# Altium footprint library Lib_001.PcbLib: 429 footprints (part 4 of 28)
Each footprint in its own frame and in the unit in brackets; x right, y up, seen from the top. Pads: shape width x height; smd on the part's side, far side on the other; paste and mask are expansions set on the pad; w line width, h text height; cw(c..) or ccw(c..) is an arc to the next point about the centre after c.
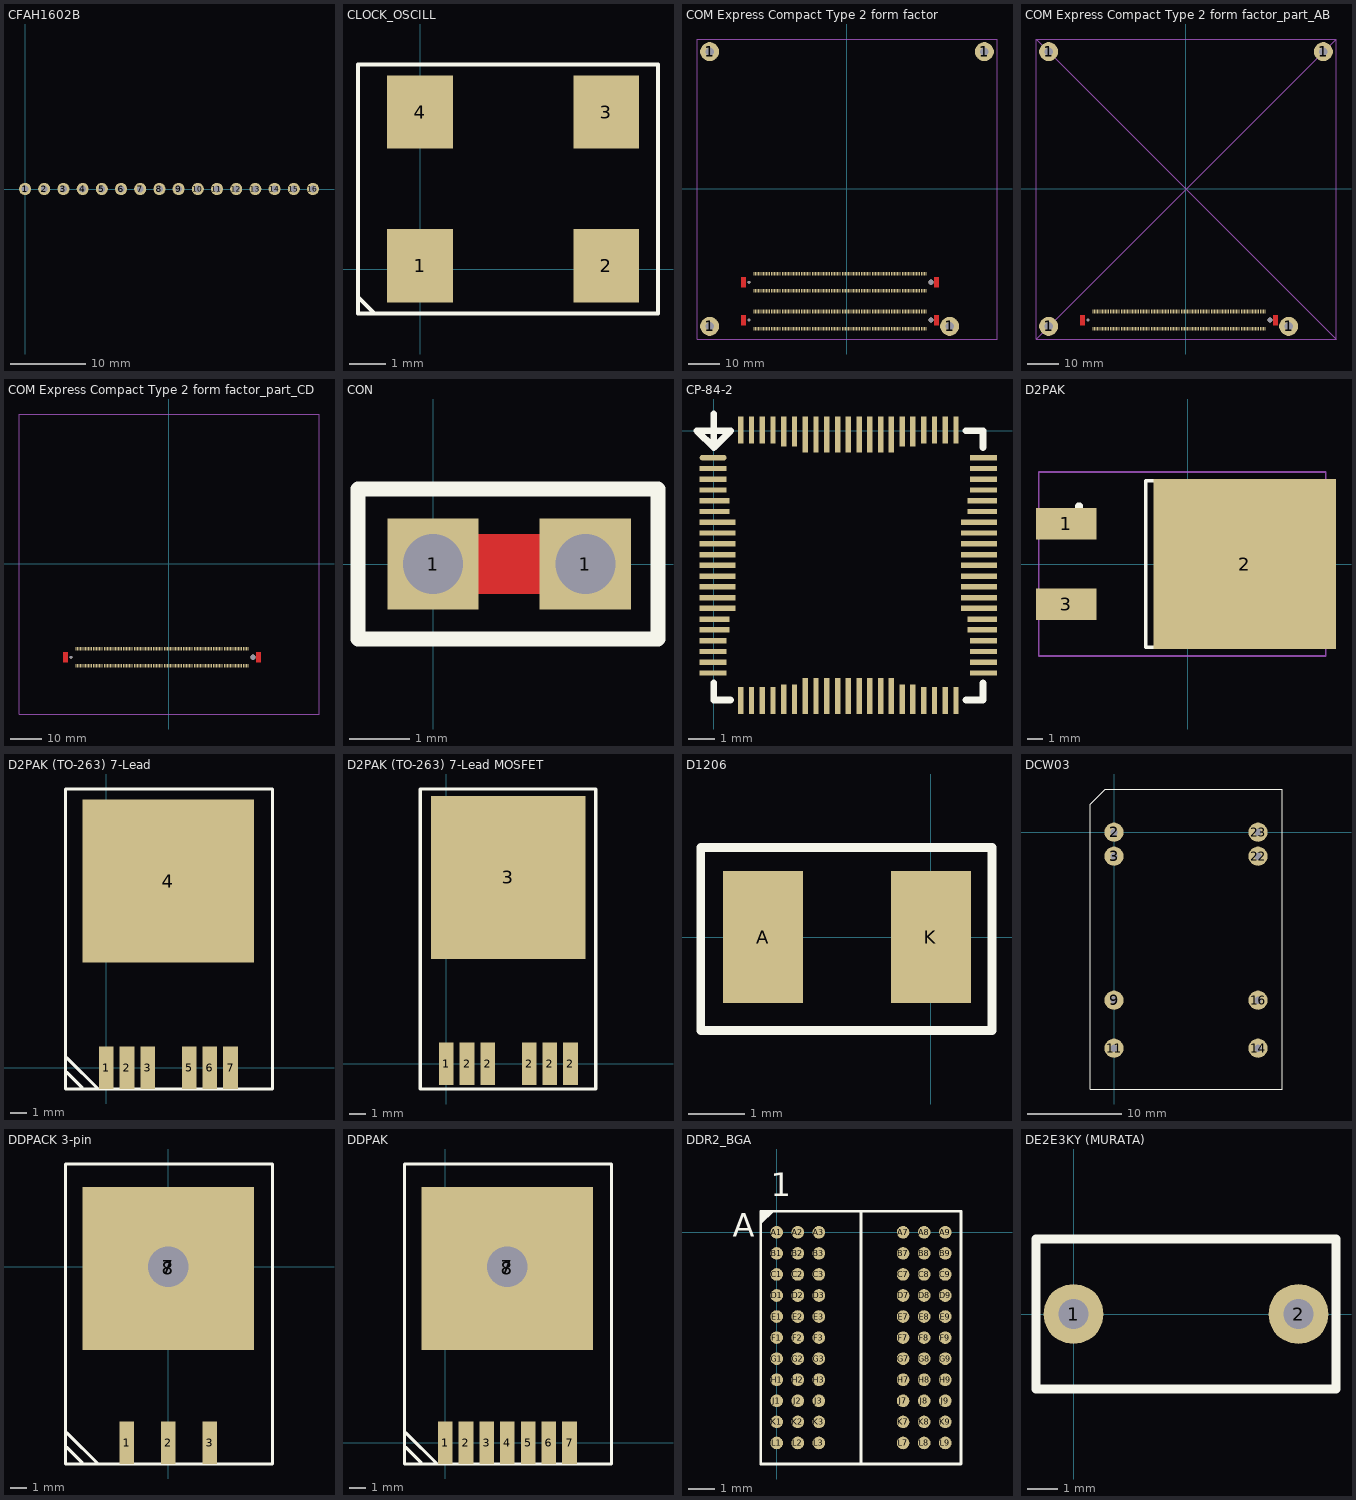
[diagram p3: the footprints below, top view; thin cyan lines are the x and y axes]

## CFAH1602B [mm]
height 6
pads (16):
  round 1.6 hole 0.9: 1(0,0) 2(2.54,0) 3(5.08,0) 4(7.62,0) 5(10.16,0) 6(12.7,0) 7(15.24,0) 8(17.78,0) 9(20.32,0) 10(22.86,0) 11(25.4,0) 12(27.94,0) 13(30.48,0) 14(33.02,0) 15(35.56,0) 16(38.1,0)
3D body "User Library-LCD module 16 X 2 backlight.step": height 18.02, standoff 4.81, extent -8.05,-34.5 72.45,2

## CLOCK_OSCILL [mm]
pads (4):
  rect 1.8x2 smd: 1(0,0.1) 2(5.08,0.1) 3(5.08,4.3) 4(0,4.3)
Top Overlay:
  lines w0.102: -1.698,-0.75 -1.25,-1.199 ; -1.698,-1.199 -1.698,5.595 -1.299,5.595 6.494,5.595 6.494,-1.199 -1.698,-1.199
3D body "User Library-KXO-97V.step": height 1.3, standoff 0, extent -0.98,-0.262 6.02,4.818

## COM Express Compact Type 2 form factor [mm]
pads (444):
  round 6 hole 2.7: 1(-43.5,-43.5) 1(-43.5,43.5) 1(32.5,-43.5) 1(43.5,43.5)
  rect 0.3x1.2 smd: A1(-29.475,-44.225) A2(-28.975,-44.225) A3(-28.475,-44.225) A4(-27.975,-44.225) A5(-27.475,-44.225) A6(-26.975,-44.225) A7(-26.475,-44.225) A8(-25.975,-44.225) A9(-25.475,-44.225) A10(-24.975,-44.225) A11(-24.475,-44.225) A12(-23.975,-44.225) A13(-23.475,-44.225) A14(-22.975,-44.225) A15(-22.475,-44.225) A16(-21.975,-44.225) A17(-21.475,-44.225) A18(-20.975,-44.225) A19(-20.475,-44.225) A20(-19.975,-44.225) A21(-19.475,-44.225) A22(-18.975,-44.225) A23(-18.475,-44.225) A24(-17.975,-44.225) A25(-17.475,-44.225) A26(-16.975,-44.225) A27(-16.475,-44.225) A28(-15.975,-44.225) A29(-15.475,-44.225) A30(-14.975,-44.225) A31(-14.475,-44.225) A32(-13.975,-44.225) A33(-13.475,-44.225) A34(-12.975,-44.225) A35(-12.475,-44.225) A36(-11.975,-44.225) A37(-11.475,-44.225) A38(-10.975,-44.225) A39(-10.475,-44.225) A40(-9.975,-44.225) A41(-9.475,-44.225) A42(-8.975,-44.225) A43(-8.475,-44.225) A44(-7.975,-44.225) A45(-7.475,-44.225) A46(-6.975,-44.225) A47(-6.475,-44.225) A48(-5.975,-44.225) A49(-5.475,-44.225) A50(-4.975,-44.225) A51(-4.475,-44.225) A52(-3.975,-44.225) A53(-3.475,-44.225) A54(-2.975,-44.225) A55(-2.475,-44.225) A56(-1.975,-44.225) A57(-1.475,-44.225) A58(-0.975,-44.225) A59(-0.475,-44.225) A60(0.025,-44.225) A61(0.525,-44.225) A62(1.025,-44.225) A63(1.525,-44.225) A64(2.025,-44.225) A65(2.525,-44.225) A66(3.025,-44.225) A67(3.525,-44.225) A68(4.025,-44.225) A69(4.525,-44.225) A70(5.025,-44.225) A71(5.525,-44.225) A72(6.025,-44.225) A73(6.525,-44.225) A74(7.025,-44.225) A75(7.525,-44.225) A76(8.025,-44.225) A77(8.525,-44.225) A78(9.025,-44.225) A79(9.525,-44.225) A80(10.025,-44.225) A81(10.525,-44.225) A82(11.025,-44.225) A83(11.525,-44.225) A84(12.025,-44.225) A85(12.525,-44.225) A86(13.025,-44.225) A87(13.525,-44.225) A88(14.025,-44.225) A89(14.525,-44.225) A90(15.025,-44.225) A91(15.525,-44.225) A92(16.025,-44.225) A93(16.525,-44.225) A94(17.025,-44.225) A95(17.525,-44.225) A96(18.025,-44.225) A97(18.525,-44.225) A98(19.025,-44.225) A99(19.525,-44.225) A100(20.025,-44.225) A101(20.525,-44.225) A102(21.025,-44.225) A103(21.525,-44.225) A104(22.025,-44.225) A105(22.525,-44.225) A106(23.025,-44.225) A107(23.525,-44.225) A108(24.025,-44.225) A109(24.525,-44.225) A110(25.025,-44.225) B1(-29.475,-38.825) B2(-28.975,-38.825) B3(-28.475,-38.825) B4(-27.975,-38.825) B5(-27.475,-38.825) B6(-26.975,-38.825) B7(-26.475,-38.825) B8(-25.975,-38.825) B9(-25.475,-38.825) B10(-24.975,-38.825) B11(-24.475,-38.825) B12(-23.975,-38.825) B13(-23.475,-38.825) B14(-22.975,-38.825) B15(-22.475,-38.825) B16(-21.975,-38.825) B17(-21.475,-38.825) B18(-20.975,-38.825) B19(-20.475,-38.825) B20(-19.975,-38.825) B21(-19.475,-38.825) B22(-18.975,-38.825) B23(-18.475,-38.825) B24(-17.975,-38.825) B25(-17.475,-38.825) B26(-16.975,-38.825) B27(-16.475,-38.825) B28(-15.975,-38.825) B29(-15.475,-38.825) B30(-14.975,-38.825) B31(-14.475,-38.825) B32(-13.975,-38.825) B33(-13.475,-38.825) B34(-12.975,-38.825) B35(-12.475,-38.825) B36(-11.975,-38.825) B37(-11.475,-38.825) B38(-10.975,-38.825) B39(-10.475,-38.825) B40(-9.975,-38.825) B41(-9.475,-38.825) B42(-8.975,-38.825) B43(-8.475,-38.825) B44(-7.975,-38.825) B45(-7.475,-38.825) B46(-6.975,-38.825) B47(-6.475,-38.825) B48(-5.975,-38.825) B49(-5.475,-38.825) B50(-4.975,-38.825) B51(-4.475,-38.825) B52(-3.975,-38.825) B53(-3.475,-38.825) B54(-2.975,-38.825) B55(-2.475,-38.825) B56(-1.975,-38.825) B57(-1.475,-38.825) B58(-0.975,-38.825) B59(-0.475,-38.825) B60(0.025,-38.825) B61(0.525,-38.825) B62(1.025,-38.825) B63(1.525,-38.825) B64(2.025,-38.825) B65(2.525,-38.825) B66(3.025,-38.825) B67(3.525,-38.825) B68(4.025,-38.825) B69(4.525,-38.825) B70(5.025,-38.825) B71(5.525,-38.825) B72(6.025,-38.825) B73(6.525,-38.825) B74(7.025,-38.825) B75(7.525,-38.825) B76(8.025,-38.825) B77(8.525,-38.825) B78(9.025,-38.825) B79(9.525,-38.825) B80(10.025,-38.825) B81(10.525,-38.825) B82(11.025,-38.825) B83(11.525,-38.825) B84(12.025,-38.825) B85(12.525,-38.825) B86(13.025,-38.825) B87(13.525,-38.825) B88(14.025,-38.825) B89(14.525,-38.825) B90(15.025,-38.825) B91(15.525,-38.825) B92(16.025,-38.825) B93(16.525,-38.825) B94(17.025,-38.825) B95(17.525,-38.825) B96(18.025,-38.825) B97(18.525,-38.825) B98(19.025,-38.825) B99(19.525,-38.825) B100(20.025,-38.825) B101(20.525,-38.825) B102(21.025,-38.825) B103(21.525,-38.825) B104(22.025,-38.825) B105(22.525,-38.825) B106(23.025,-38.825) B107(23.525,-38.825) B108(24.025,-38.825) B109(24.525,-38.825) B110(25.025,-38.825) C1(-29.475,-32.225) C2(-28.975,-32.225) C3(-28.475,-32.225) C4(-27.975,-32.225) C5(-27.475,-32.225) C6(-26.975,-32.225) C7(-26.475,-32.225) C8(-25.975,-32.225) C9(-25.475,-32.225) C10(-24.975,-32.225) C11(-24.475,-32.225) C12(-23.975,-32.225) C13(-23.475,-32.225) C14(-22.975,-32.225) C15(-22.475,-32.225) C16(-21.975,-32.225) C17(-21.475,-32.225) C18(-20.975,-32.225) C19(-20.475,-32.225) C20(-19.975,-32.225) C21(-19.475,-32.225) C22(-18.975,-32.225) C23(-18.475,-32.225) C24(-17.975,-32.225) C25(-17.475,-32.225) C26(-16.975,-32.225) C27(-16.475,-32.225) C28(-15.975,-32.225) C29(-15.475,-32.225) C30(-14.975,-32.225) C31(-14.475,-32.225) C32(-13.975,-32.225) C33(-13.475,-32.225) C34(-12.975,-32.225) C35(-12.475,-32.225) C36(-11.975,-32.225) C37(-11.475,-32.225) C38(-10.975,-32.225) C39(-10.475,-32.225) C40(-9.975,-32.225) C41(-9.475,-32.225) C42(-8.975,-32.225) C43(-8.475,-32.225) C44(-7.975,-32.225) C45(-7.475,-32.225) C46(-6.975,-32.225) C47(-6.475,-32.225) C48(-5.975,-32.225) C49(-5.475,-32.225) C50(-4.975,-32.225) C51(-4.475,-32.225) C52(-3.975,-32.225) C53(-3.475,-32.225) C54(-2.975,-32.225) C55(-2.475,-32.225) C56(-1.975,-32.225) C57(-1.475,-32.225) C58(-0.975,-32.225) C59(-0.475,-32.225) C60(0.025,-32.225) C61(0.525,-32.225) C62(1.025,-32.225) C63(1.525,-32.225) C64(2.025,-32.225) C65(2.525,-32.225) C66(3.025,-32.225) C67(3.525,-32.225) C68(4.025,-32.225) C69(4.525,-32.225) C70(5.025,-32.225) C71(5.525,-32.225) C72(6.025,-32.225) C73(6.525,-32.225) C74(7.025,-32.225) C75(7.525,-32.225) C76(8.025,-32.225) C77(8.525,-32.225) C78(9.025,-32.225) C79(9.525,-32.225) C80(10.025,-32.225) C81(10.525,-32.225) C82(11.025,-32.225) C83(11.525,-32.225) C84(12.025,-32.225) C85(12.525,-32.225) C86(13.025,-32.225) C87(13.525,-32.225) C88(14.025,-32.225) C89(14.525,-32.225) C90(15.025,-32.225) C91(15.525,-32.225) C92(16.025,-32.225) C93(16.525,-32.225) C94(17.025,-32.225) C95(17.525,-32.225) C96(18.025,-32.225) C97(18.525,-32.225) C98(19.025,-32.225) C99(19.525,-32.225) C100(20.025,-32.225) C101(20.525,-32.225) C102(21.025,-32.225) C103(21.525,-32.225) C104(22.025,-32.225) C105(22.525,-32.225) C106(23.025,-32.225) C107(23.525,-32.225) C108(24.025,-32.225) C109(24.525,-32.225) C110(25.025,-32.225) D1(-29.475,-26.825) D2(-28.975,-26.825) D3(-28.475,-26.825) D4(-27.975,-26.825) D5(-27.475,-26.825) D6(-26.975,-26.825) D7(-26.475,-26.825) D8(-25.975,-26.825) D9(-25.475,-26.825) D10(-24.975,-26.825) D11(-24.475,-26.825) D12(-23.975,-26.825) D13(-23.475,-26.825) D14(-22.975,-26.825) D15(-22.475,-26.825) D16(-21.975,-26.825) D17(-21.475,-26.825) D18(-20.975,-26.825) D19(-20.475,-26.825) D20(-19.975,-26.825) D21(-19.475,-26.825) D22(-18.975,-26.825) D23(-18.475,-26.825) D24(-17.975,-26.825) D25(-17.475,-26.825) D26(-16.975,-26.825) D27(-16.475,-26.825) D28(-15.975,-26.825) D29(-15.475,-26.825) D30(-14.975,-26.825) D31(-14.475,-26.825) D32(-13.975,-26.825) D33(-13.475,-26.825) D34(-12.975,-26.825) D35(-12.475,-26.825) D36(-11.975,-26.825) D37(-11.475,-26.825) D38(-10.975,-26.825) D39(-10.475,-26.825) D40(-9.975,-26.825) D41(-9.475,-26.825) D42(-8.975,-26.825) D43(-8.475,-26.825) D44(-7.975,-26.825) D45(-7.475,-26.825) D46(-6.975,-26.825) D47(-6.475,-26.825) D48(-5.975,-26.825) D49(-5.475,-26.825) D50(-4.975,-26.825) D51(-4.475,-26.825) D52(-3.975,-26.825) D53(-3.475,-26.825) D54(-2.975,-26.825) D55(-2.475,-26.825) D56(-1.975,-26.825) D57(-1.475,-26.825) D58(-0.975,-26.825) D59(-0.475,-26.825) D60(0.025,-26.825) D61(0.525,-26.825) D62(1.025,-26.825) D63(1.525,-26.825) D64(2.025,-26.825) D65(2.525,-26.825) D66(3.025,-26.825) D67(3.525,-26.825) D68(4.025,-26.825) D69(4.525,-26.825) D70(5.025,-26.825) D71(5.525,-26.825) D72(6.025,-26.825) D73(6.525,-26.825) D74(7.025,-26.825) D75(7.525,-26.825) D76(8.025,-26.825) D77(8.525,-26.825) D78(9.025,-26.825) D79(9.525,-26.825) D80(10.025,-26.825) D81(10.525,-26.825) D82(11.025,-26.825) D83(11.525,-26.825) D84(12.025,-26.825) D85(12.525,-26.825) D86(13.025,-26.825) D87(13.525,-26.825) D88(14.025,-26.825) D89(14.525,-26.825) D90(15.025,-26.825) D91(15.525,-26.825) D92(16.025,-26.825) D93(16.525,-26.825) D94(17.025,-26.825) D95(17.525,-26.825) D96(18.025,-26.825) D97(18.525,-26.825) D98(19.025,-26.825) D99(19.525,-26.825) D100(20.025,-26.825) D101(20.525,-26.825) D102(21.025,-26.825) D103(21.525,-26.825) D104(22.025,-26.825) D105(22.525,-26.825) D106(23.025,-26.825) D107(23.525,-26.825) D108(24.025,-26.825) D109(24.525,-26.825) D110(25.025,-26.825)
via -31.075,-41.525 diameter 0.9 hole 0.9
via 26.625,-41.525 diameter 1.6 hole 1.6
via -31.075,-29.525 diameter 0.9 hole 0.9
via 26.625,-29.525 diameter 1.6 hole 1.6
Top Layer:
  region: -31.975,-39.875 -33.625,-39.875 -33.625,-43.175 -31.975,-43.175
  region: 29.175,-39.875 27.525,-39.875 27.525,-43.175 29.175,-43.175
  region: -31.975,-27.875 -33.625,-27.875 -33.625,-31.175 -31.975,-31.175
  region: 29.175,-27.875 27.525,-27.875 27.525,-31.175 29.175,-31.175
Mechanical 1:
  lines w0.2: -47.5,-47.5 47.5,-47.5 47.5,47.5 -47.5,47.5 -47.5,-47.5
Mechanical 7:
  lines w0.2: -47.5,-47.5 -47.5,47.5 47.5,47.5 47.5,-47.5 -47.5,-47.5
Multi-Layer:
  lines w0.15: -47.5,-47.5 47.5,47.5 ; -47.5,47.5 47.5,-47.5
3D body "ept_401-55101-5x_3D.STEP": height 7.45, standoff -0.6, extent -33.125,-44.625 28.675,-38.425
3D body "ept_401-55101-5x_3D.STEP": height 7.45, standoff -0.6, extent -33.125,-32.625 28.675,-26.425

## COM Express Compact Type 2 form factor_part_AB [mm]
pads (224):
  round 6 hole 2.7: 1(-43.5,-43.5) 1(-43.5,43.5) 1(32.5,-43.5) 1(43.5,43.5)
  rect 0.3x1.2 smd: A1(-29.475,-44.225) A2(-28.975,-44.225) A3(-28.475,-44.225) A4(-27.975,-44.225) A5(-27.475,-44.225) A6(-26.975,-44.225) A7(-26.475,-44.225) A8(-25.975,-44.225) A9(-25.475,-44.225) A10(-24.975,-44.225) A11(-24.475,-44.225) A12(-23.975,-44.225) A13(-23.475,-44.225) A14(-22.975,-44.225) A15(-22.475,-44.225) A16(-21.975,-44.225) A17(-21.475,-44.225) A18(-20.975,-44.225) A19(-20.475,-44.225) A20(-19.975,-44.225) A21(-19.475,-44.225) A22(-18.975,-44.225) A23(-18.475,-44.225) A24(-17.975,-44.225) A25(-17.475,-44.225) A26(-16.975,-44.225) A27(-16.475,-44.225) A28(-15.975,-44.225) A29(-15.475,-44.225) A30(-14.975,-44.225) A31(-14.475,-44.225) A32(-13.975,-44.225) A33(-13.475,-44.225) A34(-12.975,-44.225) A35(-12.475,-44.225) A36(-11.975,-44.225) A37(-11.475,-44.225) A38(-10.975,-44.225) A39(-10.475,-44.225) A40(-9.975,-44.225) A41(-9.475,-44.225) A42(-8.975,-44.225) A43(-8.475,-44.225) A44(-7.975,-44.225) A45(-7.475,-44.225) A46(-6.975,-44.225) A47(-6.475,-44.225) A48(-5.975,-44.225) A49(-5.475,-44.225) A50(-4.975,-44.225) A51(-4.475,-44.225) A52(-3.975,-44.225) A53(-3.475,-44.225) A54(-2.975,-44.225) A55(-2.475,-44.225) A56(-1.975,-44.225) A57(-1.475,-44.225) A58(-0.975,-44.225) A59(-0.475,-44.225) A60(0.025,-44.225) A61(0.525,-44.225) A62(1.025,-44.225) A63(1.525,-44.225) A64(2.025,-44.225) A65(2.525,-44.225) A66(3.025,-44.225) A67(3.525,-44.225) A68(4.025,-44.225) A69(4.525,-44.225) A70(5.025,-44.225) A71(5.525,-44.225) A72(6.025,-44.225) A73(6.525,-44.225) A74(7.025,-44.225) A75(7.525,-44.225) A76(8.025,-44.225) A77(8.525,-44.225) A78(9.025,-44.225) A79(9.525,-44.225) A80(10.025,-44.225) A81(10.525,-44.225) A82(11.025,-44.225) A83(11.525,-44.225) A84(12.025,-44.225) A85(12.525,-44.225) A86(13.025,-44.225) A87(13.525,-44.225) A88(14.025,-44.225) A89(14.525,-44.225) A90(15.025,-44.225) A91(15.525,-44.225) A92(16.025,-44.225) A93(16.525,-44.225) A94(17.025,-44.225) A95(17.525,-44.225) A96(18.025,-44.225) A97(18.525,-44.225) A98(19.025,-44.225) A99(19.525,-44.225) A100(20.025,-44.225) A101(20.525,-44.225) A102(21.025,-44.225) A103(21.525,-44.225) A104(22.025,-44.225) A105(22.525,-44.225) A106(23.025,-44.225) A107(23.525,-44.225) A108(24.025,-44.225) A109(24.525,-44.225) A110(25.025,-44.225) B1(-29.475,-38.825) B2(-28.975,-38.825) B3(-28.475,-38.825) B4(-27.975,-38.825) B5(-27.475,-38.825) B6(-26.975,-38.825) B7(-26.475,-38.825) B8(-25.975,-38.825) B9(-25.475,-38.825) B10(-24.975,-38.825) B11(-24.475,-38.825) B12(-23.975,-38.825) B13(-23.475,-38.825) B14(-22.975,-38.825) B15(-22.475,-38.825) B16(-21.975,-38.825) B17(-21.475,-38.825) B18(-20.975,-38.825) B19(-20.475,-38.825) B20(-19.975,-38.825) B21(-19.475,-38.825) B22(-18.975,-38.825) B23(-18.475,-38.825) B24(-17.975,-38.825) B25(-17.475,-38.825) B26(-16.975,-38.825) B27(-16.475,-38.825) B28(-15.975,-38.825) B29(-15.475,-38.825) B30(-14.975,-38.825) B31(-14.475,-38.825) B32(-13.975,-38.825) B33(-13.475,-38.825) B34(-12.975,-38.825) B35(-12.475,-38.825) B36(-11.975,-38.825) B37(-11.475,-38.825) B38(-10.975,-38.825) B39(-10.475,-38.825) B40(-9.975,-38.825) B41(-9.475,-38.825) B42(-8.975,-38.825) B43(-8.475,-38.825) B44(-7.975,-38.825) B45(-7.475,-38.825) B46(-6.975,-38.825) B47(-6.475,-38.825) B48(-5.975,-38.825) B49(-5.475,-38.825) B50(-4.975,-38.825) B51(-4.475,-38.825) B52(-3.975,-38.825) B53(-3.475,-38.825) B54(-2.975,-38.825) B55(-2.475,-38.825) B56(-1.975,-38.825) B57(-1.475,-38.825) B58(-0.975,-38.825) B59(-0.475,-38.825) B60(0.025,-38.825) B61(0.525,-38.825) B62(1.025,-38.825) B63(1.525,-38.825) B64(2.025,-38.825) B65(2.525,-38.825) B66(3.025,-38.825) B67(3.525,-38.825) B68(4.025,-38.825) B69(4.525,-38.825) B70(5.025,-38.825) B71(5.525,-38.825) B72(6.025,-38.825) B73(6.525,-38.825) B74(7.025,-38.825) B75(7.525,-38.825) B76(8.025,-38.825) B77(8.525,-38.825) B78(9.025,-38.825) B79(9.525,-38.825) B80(10.025,-38.825) B81(10.525,-38.825) B82(11.025,-38.825) B83(11.525,-38.825) B84(12.025,-38.825) B85(12.525,-38.825) B86(13.025,-38.825) B87(13.525,-38.825) B88(14.025,-38.825) B89(14.525,-38.825) B90(15.025,-38.825) B91(15.525,-38.825) B92(16.025,-38.825) B93(16.525,-38.825) B94(17.025,-38.825) B95(17.525,-38.825) B96(18.025,-38.825) B97(18.525,-38.825) B98(19.025,-38.825) B99(19.525,-38.825) B100(20.025,-38.825) B101(20.525,-38.825) B102(21.025,-38.825) B103(21.525,-38.825) B104(22.025,-38.825) B105(22.525,-38.825) B106(23.025,-38.825) B107(23.525,-38.825) B108(24.025,-38.825) B109(24.525,-38.825) B110(25.025,-38.825)
via -31.075,-41.525 diameter 0.9 hole 0.9
via 26.625,-41.525 diameter 1.6 hole 1.6
Top Layer:
  region: -31.975,-39.875 -33.625,-39.875 -33.625,-43.175 -31.975,-43.175
  region: 29.175,-39.875 27.525,-39.875 27.525,-43.175 29.175,-43.175
Mechanical 1:
  lines w0.15: -47.5,-47.5 47.5,47.5 ; -47.5,47.5 47.5,-47.5
  lines w0.2: -47.5,-47.5 47.5,-47.5 47.5,47.5 -47.5,47.5 -47.5,-47.5
Mechanical 7:
  lines w0.2: -47.5,-47.5 -47.5,47.5 47.5,47.5 47.5,-47.5 -47.5,-47.5
3D body "ept_401-55101-5x_3D.STEP": height 7.45, standoff -0.6, extent -33.125,-44.625 28.675,-38.425

## COM Express Compact Type 2 form factor_part_CD [mm]
pads (220):
  rect 0.3x1.2 smd: C1(-29.475,-32.225) C2(-28.975,-32.225) C3(-28.475,-32.225) C4(-27.975,-32.225) C5(-27.475,-32.225) C6(-26.975,-32.225) C7(-26.475,-32.225) C8(-25.975,-32.225) C9(-25.475,-32.225) C10(-24.975,-32.225) C11(-24.475,-32.225) C12(-23.975,-32.225) C13(-23.475,-32.225) C14(-22.975,-32.225) C15(-22.475,-32.225) C16(-21.975,-32.225) C17(-21.475,-32.225) C18(-20.975,-32.225) C19(-20.475,-32.225) C20(-19.975,-32.225) C21(-19.475,-32.225) C22(-18.975,-32.225) C23(-18.475,-32.225) C24(-17.975,-32.225) C25(-17.475,-32.225) C26(-16.975,-32.225) C27(-16.475,-32.225) C28(-15.975,-32.225) C29(-15.475,-32.225) C30(-14.975,-32.225) C31(-14.475,-32.225) C32(-13.975,-32.225) C33(-13.475,-32.225) C34(-12.975,-32.225) C35(-12.475,-32.225) C36(-11.975,-32.225) C37(-11.475,-32.225) C38(-10.975,-32.225) C39(-10.475,-32.225) C40(-9.975,-32.225) C41(-9.475,-32.225) C42(-8.975,-32.225) C43(-8.475,-32.225) C44(-7.975,-32.225) C45(-7.475,-32.225) C46(-6.975,-32.225) C47(-6.475,-32.225) C48(-5.975,-32.225) C49(-5.475,-32.225) C50(-4.975,-32.225) C51(-4.475,-32.225) C52(-3.975,-32.225) C53(-3.475,-32.225) C54(-2.975,-32.225) C55(-2.475,-32.225) C56(-1.975,-32.225) C57(-1.475,-32.225) C58(-0.975,-32.225) C59(-0.475,-32.225) C60(0.025,-32.225) C61(0.525,-32.225) C62(1.025,-32.225) C63(1.525,-32.225) C64(2.025,-32.225) C65(2.525,-32.225) C66(3.025,-32.225) C67(3.525,-32.225) C68(4.025,-32.225) C69(4.525,-32.225) C70(5.025,-32.225) C71(5.525,-32.225) C72(6.025,-32.225) C73(6.525,-32.225) C74(7.025,-32.225) C75(7.525,-32.225) C76(8.025,-32.225) C77(8.525,-32.225) C78(9.025,-32.225) C79(9.525,-32.225) C80(10.025,-32.225) C81(10.525,-32.225) C82(11.025,-32.225) C83(11.525,-32.225) C84(12.025,-32.225) C85(12.525,-32.225) C86(13.025,-32.225) C87(13.525,-32.225) C88(14.025,-32.225) C89(14.525,-32.225) C90(15.025,-32.225) C91(15.525,-32.225) C92(16.025,-32.225) C93(16.525,-32.225) C94(17.025,-32.225) C95(17.525,-32.225) C96(18.025,-32.225) C97(18.525,-32.225) C98(19.025,-32.225) C99(19.525,-32.225) C100(20.025,-32.225) C101(20.525,-32.225) C102(21.025,-32.225) C103(21.525,-32.225) C104(22.025,-32.225) C105(22.525,-32.225) C106(23.025,-32.225) C107(23.525,-32.225) C108(24.025,-32.225) C109(24.525,-32.225) C110(25.025,-32.225) D1(-29.475,-26.825) D2(-28.975,-26.825) D3(-28.475,-26.825) D4(-27.975,-26.825) D5(-27.475,-26.825) D6(-26.975,-26.825) D7(-26.475,-26.825) D8(-25.975,-26.825) D9(-25.475,-26.825) D10(-24.975,-26.825) D11(-24.475,-26.825) D12(-23.975,-26.825) D13(-23.475,-26.825) D14(-22.975,-26.825) D15(-22.475,-26.825) D16(-21.975,-26.825) D17(-21.475,-26.825) D18(-20.975,-26.825) D19(-20.475,-26.825) D20(-19.975,-26.825) D21(-19.475,-26.825) D22(-18.975,-26.825) D23(-18.475,-26.825) D24(-17.975,-26.825) D25(-17.475,-26.825) D26(-16.975,-26.825) D27(-16.475,-26.825) D28(-15.975,-26.825) D29(-15.475,-26.825) D30(-14.975,-26.825) D31(-14.475,-26.825) D32(-13.975,-26.825) D33(-13.475,-26.825) D34(-12.975,-26.825) D35(-12.475,-26.825) D36(-11.975,-26.825) D37(-11.475,-26.825) D38(-10.975,-26.825) D39(-10.475,-26.825) D40(-9.975,-26.825) D41(-9.475,-26.825) D42(-8.975,-26.825) D43(-8.475,-26.825) D44(-7.975,-26.825) D45(-7.475,-26.825) D46(-6.975,-26.825) D47(-6.475,-26.825) D48(-5.975,-26.825) D49(-5.475,-26.825) D50(-4.975,-26.825) D51(-4.475,-26.825) D52(-3.975,-26.825) D53(-3.475,-26.825) D54(-2.975,-26.825) D55(-2.475,-26.825) D56(-1.975,-26.825) D57(-1.475,-26.825) D58(-0.975,-26.825) D59(-0.475,-26.825) D60(0.025,-26.825) D61(0.525,-26.825) D62(1.025,-26.825) D63(1.525,-26.825) D64(2.025,-26.825) D65(2.525,-26.825) D66(3.025,-26.825) D67(3.525,-26.825) D68(4.025,-26.825) D69(4.525,-26.825) D70(5.025,-26.825) D71(5.525,-26.825) D72(6.025,-26.825) D73(6.525,-26.825) D74(7.025,-26.825) D75(7.525,-26.825) D76(8.025,-26.825) D77(8.525,-26.825) D78(9.025,-26.825) D79(9.525,-26.825) D80(10.025,-26.825) D81(10.525,-26.825) D82(11.025,-26.825) D83(11.525,-26.825) D84(12.025,-26.825) D85(12.525,-26.825) D86(13.025,-26.825) D87(13.525,-26.825) D88(14.025,-26.825) D89(14.525,-26.825) D90(15.025,-26.825) D91(15.525,-26.825) D92(16.025,-26.825) D93(16.525,-26.825) D94(17.025,-26.825) D95(17.525,-26.825) D96(18.025,-26.825) D97(18.525,-26.825) D98(19.025,-26.825) D99(19.525,-26.825) D100(20.025,-26.825) D101(20.525,-26.825) D102(21.025,-26.825) D103(21.525,-26.825) D104(22.025,-26.825) D105(22.525,-26.825) D106(23.025,-26.825) D107(23.525,-26.825) D108(24.025,-26.825) D109(24.525,-26.825) D110(25.025,-26.825)
via -31.075,-29.525 diameter 0.9 hole 0.9
via 26.625,-29.525 diameter 1.6 hole 1.6
Top Layer:
  region: -31.975,-27.875 -33.625,-27.875 -33.625,-31.175 -31.975,-31.175
  region: 29.175,-27.875 27.525,-27.875 27.525,-31.175 29.175,-31.175
Mechanical 1:
  lines w0.2: -47.5,-47.5 47.5,-47.5 47.5,47.5 -47.5,47.5 -47.5,-47.5
Mechanical 7:
  lines w0.2: -47.5,-47.5 -47.5,47.5 47.5,47.5 47.5,-47.5 -47.5,-47.5
Multi-Layer:
  lines w0.15: -47.5,-47.5 47.5,47.5 ; -47.5,47.5 47.5,-47.5
3D body "ept_401-55101-5x_3D.STEP": height 7.45, standoff -0.6, extent -33.125,-32.625 28.675,-26.425

## CON [mil]
pads (2):
  rect 60x60 hole 39.37: 1(0,0) 1(100,0)
Top Layer:
  lines w39.37: 0,0 98.43,0
Top Overlay:
  lines w10: -49.21,-49.21 -49.21,49.21 -39.37,49.21 147.64,49.21 147.64,-49.21 -49.21,-49.21

## CP-84-2 [mm]
pads (84):
  oval 1x0.2 smd: 1(-0.025,-1)
  rect 1x0.2 smd: 2(-0.025,-1.4) 3(-0.025,-1.8) 4(-0.025,-2.2) 18(-0.025,-7.8) 19(-0.025,-8.2) 20(-0.025,-8.6) 21(-0.025,-9) 43(10.025,-9) 44(10.025,-8.6) 45(10.025,-8.2) 46(10.025,-7.8) 60(10.025,-2.2) 61(10.025,-1.8) 62(10.025,-1.4) 63(10.025,-1)
  rect 1.1x0.2 smd: 5(0.025,-2.6) 6(0.025,-3) 16(0.025,-7) 17(0.025,-7.4) 47(9.975,-7.4) 48(9.975,-7) 58(9.975,-3) 59(9.975,-2.6)
  rect 1.33x0.2 smd: 7(0.14,-3.4) 8(0.14,-3.8) 9(0.14,-4.2) 10(0.14,-4.6) 11(0.14,-5) 12(0.14,-5.4) 13(0.14,-5.8) 14(0.14,-6.2) 15(0.14,-6.6) 49(9.86,-6.6) 50(9.86,-6.2) 51(9.86,-5.8) 52(9.86,-5.4) 53(9.86,-5) 54(9.86,-4.6) 55(9.86,-4.2) 56(9.86,-3.8) 57(9.86,-3.4)
  rect 0.2x1 smd: 22(1,-10.025) 23(1.4,-10.025) 24(1.8,-10.025) 25(2.2,-10.025) 39(7.8,-10.025) 40(8.2,-10.025) 41(8.6,-10.025) 42(9,-10.025) 64(9,0.025) 65(8.6,0.025) 66(8.2,0.025) 67(7.8,0.025) 81(2.2,0.025) 82(1.8,0.025) 83(1.4,0.025) 84(1,0.025)
  rect 0.2x1.1 smd: 26(2.6,-9.975) 27(3,-9.975) 37(7,-9.975) 38(7.4,-9.975) 68(7.4,-0.025) 69(7,-0.025) 79(3,-0.025) 80(2.6,-0.025)
  rect 0.2x1.33 smd: 28(3.4,-9.86) 29(3.8,-9.86) 30(4.2,-9.86) 31(4.6,-9.86) 32(5,-9.86) 33(5.4,-9.86) 34(5.8,-9.86) 35(6.2,-9.86) 36(6.6,-9.86) 70(6.6,-0.14) 71(6.2,-0.14) 72(5.8,-0.14) 73(5.4,-0.14) 74(5,-0.14) 75(4.6,-0.14) 76(4.2,-0.14) 77(3.8,-0.14) 78(3.4,-0.14)
Top Overlay:
  lines w0.254: 0,-9.375 0,-10 0.625,-10 ; 0,0.625 0,0 ; 9.375,-10 10,-10 10,-9.375 ; 9.375,0 10,0 10,-0.625 ; 0,-0.625 0,0 ; 0,-0.625 -0.625,0 0,0 ; 0,-0.625 0.625,0 0,0
3D body: height 1.5, standoff 0, extent 0,-10 10,0
3D body: height 0.8, standoff 0, extent -0.005,-1.1 0.325,-0.9
3D body: height 0.8, standoff 0, extent -0.005,-1.5 0.325,-1.3
3D body: height 0.8, standoff 0, extent -0.005,-2.3 0.325,-2.1
3D body: height 0.8, standoff 0, extent -0.005,-1.9 0.325,-1.7
3D body: height 0.8, standoff 0, extent -0.005,-3.5 0.325,-3.3
3D body: height 0.8, standoff 0, extent -0.005,-3.9 0.325,-3.7
3D body: height 0.8, standoff 0, extent -0.005,-3.1 0.325,-2.9
3D body: height 0.8, standoff 0, extent -0.005,-2.7 0.325,-2.5
3D body: height 0.8, standoff 0, extent -0.005,-5.1 0.325,-4.9
3D body: height 0.8, standoff 0, extent -0.005,-5.5 0.325,-5.3
3D body: height 0.8, standoff 0, extent -0.005,-4.7 0.325,-4.5
3D body: height 0.8, standoff 0, extent -0.005,-4.3 0.325,-4.1
3D body: height 0.8, standoff 0, extent -0.005,-6.7 0.325,-6.5
3D body: height 0.8, standoff 0, extent -0.005,-7.1 0.325,-6.9
3D body: height 0.8, standoff 0, extent -0.005,-6.3 0.325,-6.1
3D body: height 0.8, standoff 0, extent -0.005,-5.9 0.325,-5.7
3D body: height 0.8, standoff 0, extent -0.005,-8.3 0.325,-8.1
3D body: height 0.8, standoff 0, extent -0.005,-8.7 0.325,-8.5
3D body: height 0.8, standoff 0, extent -0.005,-7.9 0.325,-7.7
3D body: height 0.8, standoff 0, extent -0.005,-7.5 0.325,-7.3
3D body: height 0.8, standoff 0, extent -0.005,-9.1 0.325,-8.9
3D body: height 0.8, standoff 0, extent 8.9,-10.005 9.1,-9.675
3D body: height 0.8, standoff 0, extent 7.3,-10.005 7.5,-9.675
3D body: height 0.8, standoff 0, extent 7.7,-10.005 7.9,-9.675
3D body: height 0.8, standoff 0, extent 8.5,-10.005 8.7,-9.675
3D body: height 0.8, standoff 0, extent 8.1,-10.005 8.3,-9.675
3D body: height 0.8, standoff 0, extent 5.7,-10.005 5.9,-9.675
3D body: height 0.8, standoff 0, extent 6.1,-10.005 6.3,-9.675
3D body: height 0.8, standoff 0, extent 6.9,-10.005 7.1,-9.675
3D body: height 0.8, standoff 0, extent 6.5,-10.005 6.7,-9.675
3D body: height 0.8, standoff 0, extent 4.1,-10.005 4.3,-9.675
3D body: height 0.8, standoff 0, extent 4.5,-10.005 4.7,-9.675
3D body: height 0.8, standoff 0, extent 5.3,-10.005 5.5,-9.675
3D body: height 0.8, standoff 0, extent 4.9,-10.005 5.1,-9.675
3D body: height 0.8, standoff 0, extent 2.5,-10.005 2.7,-9.675
3D body: height 0.8, standoff 0, extent 2.9,-10.005 3.1,-9.675
3D body: height 0.8, standoff 0, extent 3.7,-10.005 3.9,-9.675
3D body: height 0.8, standoff 0, extent 3.3,-10.005 3.5,-9.675
3D body: height 0.8, standoff 0, extent 1.7,-10.005 1.9,-9.675
3D body: height 0.8, standoff 0, extent 2.1,-10.005 2.3,-9.675
3D body: height 0.8, standoff 0, extent 1.3,-10.005 1.5,-9.675
3D body: height 0.8, standoff 0, extent 0.9,-10.005 1.1,-9.675
3D body: height 0.8, standoff 0, extent 9.675,-9.1 10.005,-8.9
3D body: height 0.8, standoff 0, extent 9.675,-7.5 10.005,-7.3
3D body: height 0.8, standoff 0, extent 9.675,-7.9 10.005,-7.7
3D body: height 0.8, standoff 0, extent 9.675,-8.7 10.005,-8.5
3D body: height 0.8, standoff 0, extent 9.675,-8.3 10.005,-8.1
3D body: height 0.8, standoff 0, extent 9.675,-5.9 10.005,-5.7
3D body: height 0.8, standoff 0, extent 9.675,-6.3 10.005,-6.1
3D body: height 0.8, standoff 0, extent 9.675,-7.1 10.005,-6.9
3D body: height 0.8, standoff 0, extent 9.675,-6.7 10.005,-6.5
3D body: height 0.8, standoff 0, extent 9.675,-4.3 10.005,-4.1
3D body: height 0.8, standoff 0, extent 9.675,-4.7 10.005,-4.5
3D body: height 0.8, standoff 0, extent 9.675,-5.5 10.005,-5.3
3D body: height 0.8, standoff 0, extent 9.675,-5.1 10.005,-4.9
3D body: height 0.8, standoff 0, extent 9.675,-2.7 10.005,-2.5
3D body: height 0.8, standoff 0, extent 9.675,-3.1 10.005,-2.9
3D body: height 0.8, standoff 0, extent 9.675,-3.9 10.005,-3.7
3D body: height 0.8, standoff 0, extent 9.675,-3.5 10.005,-3.3
3D body: height 0.8, standoff 0, extent 9.675,-1.9 10.005,-1.7
3D body: height 0.8, standoff 0, extent 9.675,-2.3 10.005,-2.1
3D body: height 0.8, standoff 0, extent 9.675,-1.5 10.005,-1.3
3D body: height 0.8, standoff 0, extent 9.675,-1.1 10.005,-0.9
3D body: height 0.8, standoff 0, extent 8.9,-0.325 9.1,0.005
3D body: height 0.8, standoff 0, extent 7.3,-0.325 7.5,0.005
3D body: height 0.8, standoff 0, extent 7.7,-0.325 7.9,0.005
3D body: height 0.8, standoff 0, extent 8.5,-0.325 8.7,0.005
3D body: height 0.8, standoff 0, extent 8.1,-0.325 8.3,0.005
3D body: height 0.8, standoff 0, extent 5.7,-0.325 5.9,0.005
3D body: height 0.8, standoff 0, extent 6.1,-0.325 6.3,0.005
3D body: height 0.8, standoff 0, extent 6.9,-0.325 7.1,0.005
3D body: height 0.8, standoff 0, extent 6.5,-0.325 6.7,0.005
3D body: height 0.8, standoff 0, extent 4.1,-0.325 4.3,0.005
3D body: height 0.8, standoff 0, extent 4.5,-0.325 4.7,0.005
3D body: height 0.8, standoff 0, extent 5.3,-0.325 5.5,0.005
3D body: height 0.8, standoff 0, extent 4.9,-0.325 5.1,0.005
3D body: height 0.8, standoff 0, extent 2.5,-0.325 2.7,0.005
3D body: height 0.8, standoff 0, extent 2.9,-0.325 3.1,0.005
3D body: height 0.8, standoff 0, extent 3.7,-0.325 3.9,0.005
3D body: height 0.8, standoff 0, extent 3.3,-0.325 3.5,0.005
3D body: height 0.8, standoff 0, extent 1.7,-0.325 1.9,0.005
3D body: height 0.8, standoff 0, extent 2.1,-0.325 2.3,0.005
3D body: height 0.8, standoff 0, extent 1.3,-0.325 1.5,0.005
3D body: height 0.8, standoff 0, extent 0.9,-0.325 1.1,0.005

## D2PAK [mm] "D2-PAK, 4-Leads, Body 8.8x10.4mm, Pitch 2.54mm, Lead Span 15.1mm, IPC Low Density"
height 4.69
pads (3):
  rect 3.81x2 smd: 1(-7.66,2.54) 3(-7.66,-2.54)
  rect 11.5x10.7 smd: 2(3.6,0)
Top Overlay:
  circle w0.25: c-6.85,3.64 r0.125
  lines w0.2: -1.4,-5.25 -2.65,-5.25 -2.65,5.25 -1.4,5.25
Mechanical 13:
  lines w0.1: -2.65,-5.275 6.35,-5.275 6.35,5.275 -2.65,5.275 -2.65,-5.275
Mechanical 15:
  lines w0.1: -0.5,0 0.5,0 ; 0,-0.5 0,0.5 ; -9.38,-5.8 8.7,-5.8 8.7,5.8 -9.38,5.8 -9.38,-5.8
3D body "User Library-DPAK.step": height 4.98, standoff -0.03, extent -8.176,-5.07 7.088,5.09

## D2PAK (TO-263) 7-Lead [mm]
pads (7):
  rect 0.9x2.6 smd: 1(0,0) 2(1.27,0) 3(2.54,0) 5(5.08,0) 6(6.35,0) 7(7.62,0)
  rect 10.5x10 smd: 4(3.8,11.45)
Top Overlay:
  lines w0.2: -2.398,-0.3 -1.499,-1.199 ; -2.398,0.599 -0.5,-1.299 ; -2.498,-1.299 -2.498,17.1 10.19,17.1 10.19,-1.299 -2.498,-1.299
3D body "SW3dPS-TO263-7S.STEP": height 5.07, standoff 0.27, extent -1.21,-0.41 8.79,15.26

## D2PAK (TO-263) 7-Lead MOSFET [mm]
pads (7):
  rect 0.9x2.6 smd: 1(0,0) 2(1.27,0) 2(2.54,0) 2(5.08,0) 2(6.35,0) 2(7.62,0)
  rect 9.5x10 smd: 3(3.8,11.45)
Top Overlay:
  lines w0.2: -1.61,-1.54 9.18,-1.54 9.18,16.88 -1.61,16.88 -1.61,-1.54
3D body "SW3dPS-TO263-7S.STEP": height 5.07, standoff 0.27, extent -1.21,-0.41 8.79,15.26

## D1206 [mil]
height 78.74
pads (2):
  rect 56x92 smd: A(-117,0) K(0,0)
Top Overlay:
  lines w6: -160.5,-65 -160.5,11 -160.5,62.5 42.5,62.5 42.5,-65 -160.5,-65
3D body: height 59.06, standoff 0, extent -118.11,-45.28 0,45.28
3D body: height 59.06, standoff 0, extent -137.8,-45.28 -118.11,45.28
3D body: height 59.06, standoff 0, extent 0,-45.28 19.68,45.28
3D body: height 59.45, standoff 55.12, extent -29.53,-44.88 -9.84,44.88

## DCW03 [mil] "3W DC-DC Regulated Dual Output Converter"
height 480
pads (8):
  round 80 hole 30: 2(0,0) 3(0,-100) 9(0,-700) 11(0,-900) 14(600,-900) 16(600,-700) 22(600,-100) 23(600,0)
Top Overlay:
  lines w3.94: -100,-1070 -100,116.54 -36.54,180 700,180 700,-1070 -100,-1070
3D body "User Library-TEN3_Dual output.step": height 422.05, standoff -177.17, extent -98.42,-1078.74 700.79,181.1

## DDPACK 3-pin [mm]
pads (5):
  rect 0.9x2.6 smd: 1(-2.54,-10.8) 2(0,-10.8) 3(2.54,-10.8)
  round 2.8 hole 2.5: 7(0,0)
  rect 10.5x10 smd: 8(0,-0.1)
Top Overlay:
  lines w0.2: -6.198,-11.1 -5.299,-11.999 ; -6.198,-10.201 -4.3,-12.099 ; -6.298,-12.099 -6.298,6.3 6.39,6.3 6.39,-12.099 -6.298,-12.099
3D body "User Library-D2PAK-7.step": height 4.5, standoff 0, extent -5.18,-11.195 5.22,4.479

## DDPAK [mm]
pads (9):
  rect 0.9x2.6 smd: 1(0,0) 2(1.27,0) 3(2.54,0) 4(3.81,0) 5(5.08,0) 6(6.35,0) 7(7.62,0)
  round 2.8 hole 2.5: 7(3.8,10.8)
  rect 10.5x10 smd: 8(3.8,10.7)
Top Overlay:
  lines w0.2: -2.398,-0.3 -1.499,-1.199 ; -2.398,0.599 -0.5,-1.299 ; -2.498,-1.299 10.19,-1.299 10.19,17.1 -2.498,17.1 -2.498,-1.299
3D body "User Library-D2PAK-7.step": height 4.5, standoff 0, extent -1.38,-0.395 9.02,15.279

## DDR2_BGA [mm]
pads (66):
  round 0.48 smd: A1(0,0) A2(0.8,0) A3(1.6,0) A7(4.8,0) A8(5.6,0) A9(6.4,0) B1(0,-0.8) B2(0.8,-0.8) B3(1.6,-0.8) B7(4.8,-0.8) B8(5.6,-0.8) B9(6.4,-0.8) C1(0,-1.6) C2(0.8,-1.6) C3(1.6,-1.6) C7(4.8,-1.6) C8(5.6,-1.6) C9(6.4,-1.6) D1(0,-2.4) D2(0.8,-2.4) D3(1.6,-2.4) D7(4.8,-2.4) D8(5.6,-2.4) D9(6.4,-2.4) E1(0,-3.2) E2(0.8,-3.2) E3(1.6,-3.2) E7(4.8,-3.2) E8(5.6,-3.2) E9(6.4,-3.2) F1(0,-4) F2(0.8,-4) F3(1.6,-4) F7(4.8,-4) F8(5.6,-4) F9(6.4,-4) G1(0,-4.8) G2(0.8,-4.8) G3(1.6,-4.8) G7(4.8,-4.8) G8(5.6,-4.8) G9(6.4,-4.8) H1(0,-5.6) H2(0.8,-5.6) H3(1.6,-5.6) H7(4.8,-5.6) H8(5.6,-5.6) H9(6.4,-5.6) J1(0,-6.4) J2(0.8,-6.4) J3(1.6,-6.4) J7(4.8,-6.4) J8(5.6,-6.4) J9(6.4,-6.4) K1(0,-7.2) K2(0.8,-7.2) K3(1.6,-7.2) K7(4.8,-7.2) K8(5.6,-7.2) K9(6.4,-7.2) L1(0,-8) L2(0.8,-8) L3(1.6,-8) L7(4.8,-8) L8(5.6,-8) L9(6.4,-8)
Top Overlay:
  region: -0.6,0.8 -0.6,0.3 -0.1,0.8
  lines w0.1: 3.2,-8.8 3.2,0.8 ; -0.6,-8.8 7,-8.8 7,0.8 -0.6,0.8 -0.6,-8.8
  text "1" at -0.23,1.07 h1.52
  text "A" at -1.66,-0.47 h1.52
3D body: height 0.39, standoff -0.09, extent 0.563,-8.239 1.04,-7.761
3D body: height 0.39, standoff -0.09, extent 1.363,-8.239 1.84,-7.761
3D body: height 0.39, standoff -0.09, extent 4.563,-8.239 5.04,-7.761
3D body: height 0.39, standoff -0.09, extent 5.363,-8.239 5.84,-7.761
3D body: height 0.39, standoff -0.09, extent 6.163,-8.239 6.64,-7.761
3D body: height 0.39, standoff -0.09, extent -0.237,-7.439 0.24,-6.961
3D body: height 0.39, standoff -0.09, extent 0.563,-7.439 1.04,-6.961
3D body: height 0.39, standoff -0.09, extent 1.363,-7.439 1.84,-6.961
3D body: height 0.39, standoff -0.09, extent 4.563,-7.439 5.04,-6.961
3D body: height 0.39, standoff -0.09, extent 5.363,-7.439 5.84,-6.961
3D body: height 0.39, standoff -0.09, extent 0.563,-6.639 1.04,-6.161
3D body: height 0.39, standoff -0.09, extent 1.363,-6.639 1.84,-6.161
3D body: height 0.39, standoff -0.09, extent 4.563,-6.639 5.04,-6.161
3D body: height 0.39, standoff -0.09, extent 5.363,-6.639 5.84,-6.161
3D body: height 0.39, standoff -0.09, extent 6.163,-6.639 6.64,-6.161
3D body: height 0.39, standoff -0.09, extent -0.237,-3.439 0.24,-2.961
3D body: height 0.39, standoff -0.09, extent 0.563,-3.439 1.04,-2.961
3D body: height 0.39, standoff -0.09, extent 1.363,-3.439 1.84,-2.961
3D body: height 0.39, standoff -0.09, extent 4.563,-3.439 5.04,-2.961
3D body: height 0.39, standoff -0.09, extent 5.363,-3.439 5.84,-2.961
3D body: height 0.39, standoff -0.09, extent 6.163,-3.439 6.64,-2.961
3D body: height 0.39, standoff -0.09, extent 5.363,-4.239 5.84,-3.761
3D body: height 0.39, standoff -0.09, extent 4.563,-4.239 5.04,-3.761
3D body: height 0.39, standoff -0.09, extent 1.363,-4.239 1.84,-3.761
3D body: height 0.39, standoff -0.09, extent 0.563,-4.239 1.04,-3.761
3D body: height 0.39, standoff -0.09, extent -0.237,-4.239 0.24,-3.761
3D body: height 0.39, standoff -0.09, extent 6.163,-5.039 6.64,-4.561
3D body: height 0.39, standoff -0.09, extent 5.363,-5.039 5.84,-4.561
3D body: height 0.39, standoff -0.09, extent 4.563,-5.039 5.04,-4.561
3D body: height 0.39, standoff -0.09, extent 1.363,-5.039 1.84,-4.561
3D body: height 0.39, standoff -0.09, extent 0.563,-5.039 1.04,-4.561
3D body: height 0.39, standoff -0.09, extent 5.363,-5.839 5.84,-5.361
3D body: height 0.39, standoff -0.09, extent 4.563,-5.839 5.04,-5.361
3D body: height 0.39, standoff -0.09, extent 1.363,-5.839 1.84,-5.361
3D body: height 0.39, standoff -0.09, extent 0.563,-5.839 1.04,-5.361
3D body: height 0.39, standoff -0.09, extent -0.237,-5.839 0.24,-5.361
3D body: height 0.39, standoff -0.09, extent -0.237,-2.639 0.24,-2.161
3D body: height 0.39, standoff -0.09, extent 0.563,-2.639 1.04,-2.161
3D body: height 0.39, standoff -0.09, extent 1.363,-2.639 1.84,-2.161
3D body: height 0.39, standoff -0.09, extent 4.563,-2.639 5.04,-2.161
3D body: height 0.39, standoff -0.09, extent 5.363,-2.639 5.84,-2.161
3D body: height 0.39, standoff -0.09, extent 6.163,-2.639 6.64,-2.161
3D body: height 0.39, standoff -0.09, extent -0.237,-1.839 0.24,-1.361
3D body: height 0.39, standoff -0.09, extent 0.563,-1.839 1.04,-1.361
3D body: height 0.39, standoff -0.09, extent 1.363,-1.839 1.84,-1.361
3D body: height 0.39, standoff -0.09, extent 4.563,-1.839 5.04,-1.361
3D body: height 0.39, standoff -0.09, extent 5.363,-1.839 5.84,-1.361
3D body: height 0.39, standoff -0.09, extent 6.163,-1.839 6.64,-1.361
3D body: height 0.39, standoff -0.09, extent -0.237,-1.039 0.24,-0.561
3D body: height 0.39, standoff -0.09, extent 0.563,-1.039 1.04,-0.561
3D body: height 0.39, standoff -0.09, extent 1.363,-1.039 1.84,-0.561
3D body: height 0.39, standoff -0.09, extent 4.563,-1.039 5.04,-0.561
3D body: height 0.39, standoff -0.09, extent 5.363,-1.039 5.84,-0.561
3D body: height 0.39, standoff -0.09, extent 6.163,-1.039 6.64,-0.561
3D body: height 0.39, standoff -0.09, extent 6.163,-0.239 6.64,0.239
3D body: height 0.39, standoff -0.09, extent 5.363,-0.239 5.84,0.239
3D body: height 0.39, standoff -0.09, extent 4.563,-0.239 5.04,0.239
3D body: height 0.39, standoff -0.09, extent 1.363,-0.239 1.84,0.239
3D body: height 0.39, standoff -0.09, extent 0.563,-0.239 1.04,0.239
3D body: height 0.39, standoff -0.09, extent -0.237,-0.239 0.24,0.239
3D body: height 1.1, standoff 0.3, extent -0.6,-8.8 7,0.8

## DE2E3KY (MURATA) [mm]
pads (2):
  round 2 hole 1: 1(0,0) 2(7.5,0)
Top Overlay:
  lines w0.3: -1.25,-2.5 -1.25,2.5 8.75,2.5 8.75,-2.5 -1.25,-2.5
3D body "User Library-K10-17 11_5x5x9.STEP": height 12, standoff -2.5, extent -1.95,-2.5 9.55,2.5